# Altium footprint library ConnectorsTDH.PcbLib: 194 footprints (part 13 of 13)
Each footprint in its own frame and in the unit in brackets; x right, y up, seen from the top. Pads: shape width x height; smd on the part's side, far side on the other; paste and mask are expansions set on the pad; w line width, h text height; cw(c..) or ccw(c..) is an arc to the next point about the centre after c.
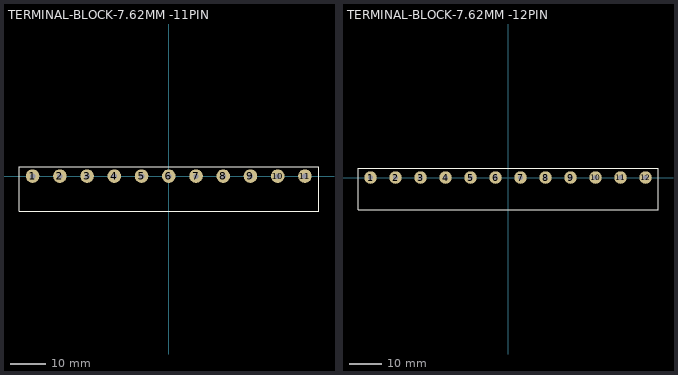
[diagram p12: the footprints below, top view; thin cyan lines are the x and y axes]

## TERMINAL-BLOCK-7.62MM -11PIN [mil]
pads (11):
  round 150 hole 60: 1(-1500,0) 2(-1200,0) 3(-900,0) 4(-600,0) 5(-300,0) 6(0,0) 7(300,0) 8(600,0) 9(900,0) 10(1200,0) 11(1500,0)
Top Overlay:
  lines w10: -1650,-390 1655,-390 1655,105 -1650,105 -1650,-385 -1650,-390
3D body "BR-76231C-11.stp": height 409.45, standoff -157.48, extent -1650,-386.07 1650,106.06

## TERMINAL-BLOCK-7.62MM -12PIN [mil]
pads (12):
  round 150 hole 60: 1(-1650,0) 2(-1350,0) 3(-1050,0) 4(-750,0) 5(-450,0) 6(-150,0) 7(150,0) 8(450,0) 9(750,0) 10(1050,0) 11(1350,0) 12(1650,0)
Top Overlay:
  lines w10: -1800,-385 1800,-385 1800,110 -1800,110 -1800,-385
3D body "BR-76231C-12.stp": height 409.45, standoff -157.48, extent -1800,-386.07 1800,106.06